# Altium footprint library csy.PcbLib: 198 footprints (part 4 of 13)
Each footprint in its own frame and in the unit in brackets; x right, y up, seen from the top. Pads: shape width x height; smd on the part's side, far side on the other; paste and mask are expansions set on the pad; w line width, h text height; cw(c..) or ccw(c..) is an arc to the next point about the centre after c.
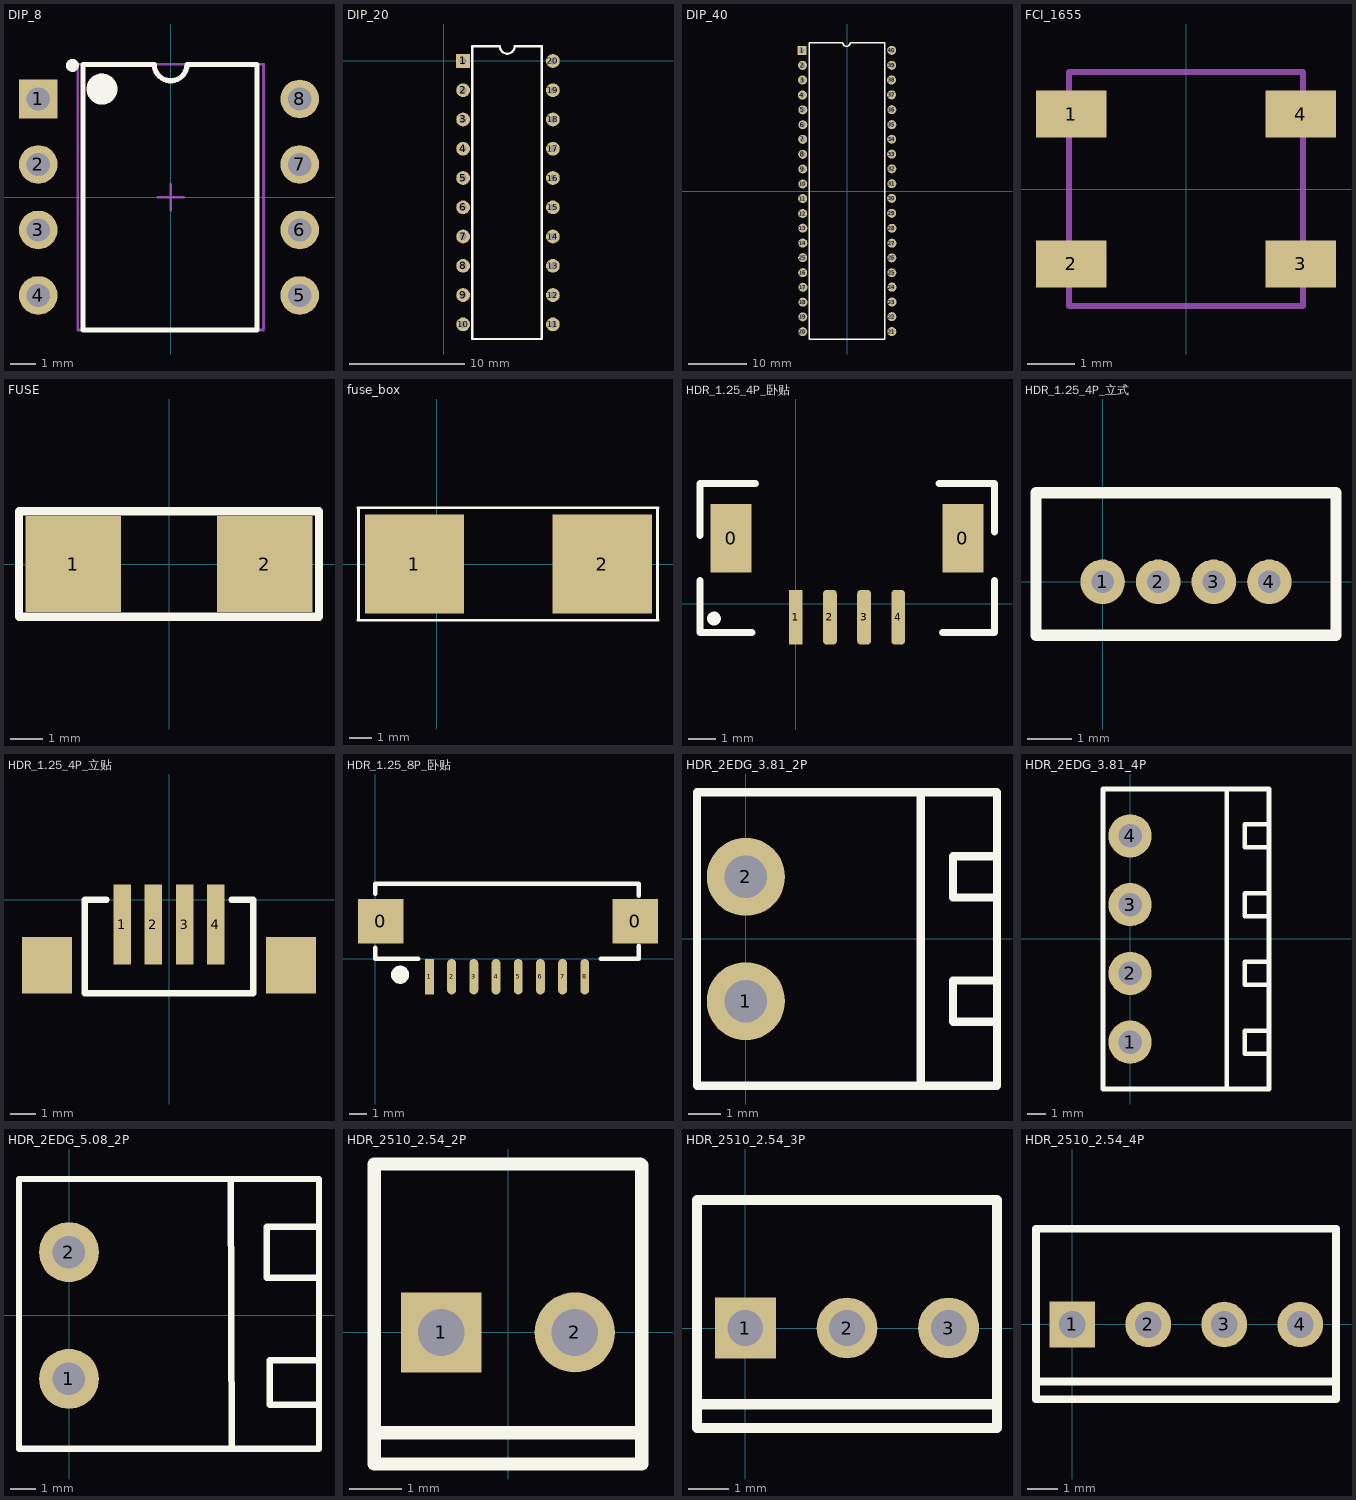
[diagram p3: the footprints below, top view; thin cyan lines are the x and y axes]

## DIP_8 [mm]
pads (8):
  rect 1.5x1.5 hole 0.9: 1(-5.131,3.81)
  round 1.5 hole 0.9: 2(-5.131,1.27) 3(-5.131,-1.27) 4(-5.131,-3.81) 5(5.004,-3.81) 6(5.004,-1.27) 7(5.004,1.27) 8(5.004,3.81)
Top Overlay:
  circle w0.25: c-3.81,5.11 r0.125
  circle w0.6: c-2.662,4.191 r0.3
  lines w0.2: -3.404,-5.15 -3.404,5.15 -0.635,5.15 ccw(c0,5.15) 0.635,5.15 3.353,5.15 3.353,-5.15 -3.404,-5.15
Mechanical 13:
  circle w0.1: c-2.7,4.25 r0.5
  lines w0.1: -3.6,-5.15 -3.6,5.15 3.6,5.15 3.6,-5.15 -3.6,-5.15
Mechanical 15:
  lines w0.1: -0.5,0 0.5,0 ; 0,-0.5 0,0.5
3D body: height 5.08, standoff 0, extent -3.6,-5.15 3.6,5.15

## DIP_20 [mm]
pads (20):
  rect 1.2x1.2 hole 0.6: 1(1.668,0)
  round 1.2 hole 0.6: 2(1.668,-2.54) 3(1.668,-5.08) 4(1.668,-7.62) 5(1.668,-10.16) 6(1.668,-12.7) 7(1.668,-15.24) 8(1.668,-17.78) 9(1.668,-20.32) 10(1.668,-22.86) 11(9.459,-22.86) 12(9.459,-20.32) 13(9.459,-17.78) 14(9.459,-15.24) 15(9.459,-12.7) 16(9.459,-10.16) 17(9.459,-7.62) 18(9.459,-5.08) 19(9.459,-2.54) 20(9.459,0)
Top Overlay:
  lines w0.2: 2.464,-24.13 2.464,1.27 4.865,1.27 ccw(c5.5,1.27) 6.135,1.27 8.484,1.27 8.484,-24.13 2.464,-24.13
3D body "DIP-20-300.STEP": height 4.5, standoff -3.5, extent 1.657,-24.052 9.418,1.548

## DIP_40 [mil]
pads (40):
  rect 61x61 hole 35: 1(-303.75,949.38)
  round 61 hole 35: 2(-300.42,848.96) 3(-300.42,749.79) 4(-301.25,648.13) 5(-298.33,548.54) 6(-298.33,447.71) 7(-299.17,348.96) 8(-299.17,248.13) 9(-298.75,148.54) 10(-298.75,47.71) 11(-299.58,-51.04) 12(-299.58,-151.87) 13(-298.33,-250.62) 14(-298.33,-351.46) 16(-299.17,-551.04) 17(-297.92,-649.79) 18(-297.92,-750.62) 19(-298.75,-849.37) 20(-298.75,-950.21) 21(302.92,-949.37) 22(302.92,-848.54) 23(303.75,-749.79) 24(303.75,-648.96) 25(-299.17,-450.21) 25(302.5,-551.87) 26(302.5,-451.04) 27(303.33,-352.29) 28(303.33,-251.46) 29(301.67,-150.21) 30(301.67,-49.37) 31(302.5,49.38) 32(302.5,150.21) 33(301.67,248.96) 34(301.67,349.79) 35(302.5,448.54) 36(302.5,549.38) 37(300.83,649.79) 38(300.83,750.63) 39(301.67,849.38) 40(301.67,950.21)
Top Overlay:
  lines w10: -254.17,-999.37 -254.17,1001.88 -28.33,1001.88 ccw(c-3.33,1001.88) 21.67,1001.88 253.75,1001.88 253.75,-999.37 -254.17,-999.37
3D body "DIP40.step": height 224.41, standoff -101.57, extent -303.84,-1025.48 306,1039.48

## FCI_1655 [mm]
pads (4):
  rect 1.5x1 smd: 1(-2.45,1.6) 2(-2.45,-1.6) 3(2.45,-1.6) 4(2.45,1.6)
Mechanical 4:
  lines w0.127: -2.5,-2.5 -2.5,2.5 ; -2.5,-2.5 2.5,-2.5 ; -2.5,-2.5 -2.5,2.5 ; -2.5,-2.5 2.5,-2.5 ; -2.5,2.5 2.5,2.5 ; -2.5,2.5 2.5,2.5 ; 2.5,-2.5 2.5,2.5 ; 2.5,-2.5 2.5,2.5

## FUSE [mm] "1808"
pads (2):
  rect 3x3 smd: 1(-3,0) 2(3,0)
Top Overlay:
  lines w0.254: -4.699,-1.651 -4.699,1.651 4.699,1.651 4.699,-1.651 -4.699,-1.651

## fuse_box [mm]
pads (2):
  rect 4.5x4.5 smd: 1(-1,0) 2(7.5,0)
Top Overlay:
  lines w0.127: -3.556,-2.55 10.033,-2.55 ; -3.556,2.55 10.033,2.55 ; -3.54,-2.55 -3.54,2.55 ; 10.017,-2.55 10.017,2.55
3D body "保险丝.STEP": height 3.96, standoff 0.16, extent -1.825,-2.587 8.175,2.413

## HDR_1.25_4P_卧贴 [mm]
pads (6):
  rect 1.5x2.5 smd: 0(-2.375,2.4) 0(6.125,2.4)
  rect 0.5x2 smd: 1(0,-0.5)
  rrect50% 0.5x2 smd: 2(1.25,-0.5) 3(2.5,-0.5) 4(3.75,-0.5)
Top Overlay:
  circle w0.254: c-3.002,-0.547 r0.127
  lines w0.254: -3.51,0.85 -3.51,-1.055 -1.605,-1.055 ; -3.51,2.501 -3.51,4.406 -1.478,4.406 ; 5.253,4.406 7.285,4.406 7.285,2.628 ; 5.38,-1.055 7.285,-1.055 7.285,0.85

## HDR_1.25_4P_立式 [mm]
pads (4):
  round 1 hole 0.5: 1(0,0) 2(1.25,0) 3(2.5,0) 4(3.75,0)
Top Overlay:
  lines w0.254: -1.5,-1.2 5.25,-1.2 5.25,2 -1.5,2 -1.5,-1.2
3D body "1.STEP": height 4.7, standoff -2.3, extent -1.597,-1.143 5.153,2.057

## HDR_1.25_4P_立贴 [mm]
pads (6):
  rect 0.7x3.2 smd: 1(-1.875,-1) 2(-0.625,-1) 3(0.625,-1) 4(1.875,-1)
  rect 2x2.25 smd: ""(-4.875,-2.625) ""(4.875,-2.625)
Top Overlay:
  lines w0.254: -2.5,0 -3.375,0 -3.375,-3.75 3.375,-3.75 3.375,0 2.5,0
3D body "1.25-AB.STEP": height 4.8, standoff 0, extent -4.826,-3.755 4.924,-0.055

## HDR_1.25_8P_卧贴 [mm]
pads (10):
  rect 2.55x2.5 smd: 0(0.3,2.125) 0(14.651,2.125)
  rect 0.5x2 smd: 1(3.05,-1)
  oval 0.5x2 smd: 2(4.3,-1) 3(5.55,-1) 4(6.8,-1) 5(8.05,-1) 6(9.3,-1) 7(10.55,-1) 8(11.8,-1)
Top Overlay:
  circle w0.508: c1.397,-0.889 r0.254
  lines w0.254: 0,0.635 0,0 2.413,0 ; 0,3.683 0,4.25 14.85,4.25 14.85,3.565 ; 12.7,0 14.85,0 14.85,0.753

## HDR_2EDG_3.81_2P [mm]
pads (2):
  round 2.4 hole 1.3: 1(0,-1.905) 2(0,1.905)
Top Overlay:
  lines w0.254: 5.359,-4.5 5.359,4.5 ; 7.573,-2.54 6.35,-2.54 6.35,-1.27 7.7,-1.27 ; 7.7,1.27 6.35,1.27 6.35,2.54 7.7,2.54 ; -1.5,-4.5 -1.5,4.5 7.7,4.5 7.7,-4.5 -1.5,-4.5
3D body "CON_凤凰端子3.81_Header2.STEP": height 7.61, standoff -3.89, extent -1.019,-4.191 8.131,4.209

## HDR_2EDG_3.81_4P [mm]
pads (4):
  round 2.4 hole 1.3: 1(0,-5.715) 2(0,-1.905) 3(0,1.905) 4(0,5.715)
Top Overlay:
  lines w0.254: 5.359,-8.31 5.359,8.31 ; 7.573,-6.35 6.35,-6.35 6.35,-5.08 7.7,-5.08 ; 7.573,1.27 6.35,1.27 6.35,2.54 7.7,2.54 ; 7.7,-2.54 6.35,-2.54 6.35,-1.27 7.7,-1.27 ; 7.7,5.08 6.35,5.08 6.35,6.35 7.7,6.35 ; -1.5,-8.31 7.7,-8.31 7.7,8.31 -1.5,8.31 -1.5,-8.31
3D body "CON_凤凰端子3.81_Header4.STEP": height 7.6, standoff -3.9, extent -1.143,-8.01 8.007,8.01

## HDR_2EDG_5.08_2P [mm]
pads (2):
  round 2.4 hole 1.3: 1(0,-2.535) 2(0,2.535)
Top Overlay:
  lines w0.254: 6.477,5.461 6.509,-5.343 ; 10,-3.565 8.033,-3.565 8.033,-1.787 10,-1.787 ; 10,1.515 7.906,1.515 7.906,3.547 10,3.547 ; -2,-5.334 -2,5.461 10,5.461 10,-5.334 -2,-5.334
3D body "CON_凤凰端子_Header2.STEP": height 3.89, standoff -8.31, extent -2.011,-5.208 9.989,5.292

## HDR_2510_2.54_2P [mil]
height 153.54
pads (2):
  rect 60x60 hole 35: 1(-50,0)
  round 60 hole 35: 2(50,0)
Top Overlay:
  lines w10: -100,-75 100,-75 ; 99.02,125.98 -100,125.98 -100,-98.43 100,-98.43 100,125
3D body "接插件CON2.54_2J.": height 430.71, standoff -167.72, extent -100,-100 100,128.35

## HDR_2510_2.54_3P [mil]
height 153.54
pads (3):
  rect 60x60 hole 35: 1(0,0)
  round 60 hole 35: 2(100,0) 3(200,0)
Top Overlay:
  lines w10: -45,-75 245,-75 ; 247.64,125 247.64,-98.43 -47.64,-98.43 -47.64,125.98 247.64,125.98
3D body "接插件CON2.54_3J.STEP": height 430.71, standoff -167.72, extent -52,-100.35 248,128

## HDR_2510_2.54_4P [mil]
pads (4):
  rect 60x60 hole 35: 1(0,0)
  round 60 hole 35: 2(100,0) 3(200,0) 4(300,0)
Top Overlay:
  lines w10: -47.64,-75 347,-75 ; -47.64,-98.43 347,-98.43 347,125.98 -47.64,125.98 -47.64,-98.43
3D body "SW3dPS-CON-148.STEP": height 472.46, standoff -137.8, extent -34,-130.38 340.01,105.84